# Altium integrated library Altium_WCAP-ATLI_rev19a.IntLib: 162 symbols (part 1 of 2) (continued)
## 860080475018
designator C?, comment 680uF, 25V
WCAP-ATLI THT Aluminum Electrolytic Capacitors, D10mm x L20mm, 680uF, +/-20%, 25VDC; Part Number: 860080475018; Dissipation Factor: 10%; Endurance: 5000h; Leakage Current: 170uA; Ripple Current max.: 1570mA; Technical Reference: ATEF200681M025DSPAAE000; ComponentLink1Description: Manufacturer; ComponentLink1URL: http://www.we-online.de; ComponentLink2Description: Datasheet; ComponentLink2URL: https://katalog.we-online.com/pbs/datasheet/860080475018.pdf; Length: 20mm; Mounting Technology: THT; Operating Temperature: -55 to +105degC; Packaging: Ammo Pack; Published Date: August 2019; Capacitance: 680uF; Diameter: 10mm; Publisher: Wurth Elektronik; Capacitance Tolerance: +/-20%; Rated Voltage: 25VDC
footprint WCAP-ATLI_10x20
pins: 1 N, 2 P

## 860080475019
designator C?, comment 820uF, 25V
WCAP-ATLI THT Aluminum Electrolytic Capacitors, D10mm x L25mm, 820uF, +/-20%, 25VDC; Part Number: 860080475019; Dissipation Factor: 10%; Endurance: 5000h; Leakage Current: 205uA; Ripple Current max.: 1910mA; Technical Reference: ATEF250821M025DSPAAE000; ComponentLink1Description: Manufacturer; ComponentLink1URL: http://www.we-online.de; ComponentLink2Description: Datasheet; ComponentLink2URL: https://katalog.we-online.com/pbs/datasheet/860080475019.pdf; Length: 25mm; Mounting Technology: THT; Operating Temperature: -55 to +105degC; Packaging: Ammo Pack; Published Date: August 2019; Capacitance: 820uF; Diameter: 10mm; Publisher: Wurth Elektronik; Capacitance Tolerance: +/-20%; Rated Voltage: 25VDC
footprint WCAP-ATLI_10x25
pins: 1 N, 2 P

## 860080478020
designator C?, comment 1000uF, 25V
WCAP-ATLI THT Aluminum Electrolytic Capacitors, D13mm x L20mm, 1000uF, +/-20%, 25VDC; Part Number: 860080478020; Dissipation Factor: 10%; Endurance: 5000h; Leakage Current: 250uA; Ripple Current max.: 2340mA; Technical Reference: ATEI200102M025DSPACE000; ComponentLink1Description: Manufacturer; ComponentLink1URL: http://www.we-online.de; ComponentLink2Description: Datasheet; ComponentLink2URL: https://katalog.we-online.com/pbs/datasheet/860080478020.pdf; Length: 20mm; Mounting Technology: THT; Operating Temperature: -55 to +105degC; Packaging: Ammo Pack; Published Date: August 2019; Capacitance: 1000uF; Diameter: 13mm; Publisher: Wurth Elektronik; Capacitance Tolerance: +/-20%; Rated Voltage: 25VDC
footprint WCAP-ATLI_13x20
pins: 1 N, 2 P

## 860080478021
designator C?, comment 1200uF, 25V
WCAP-ATLI THT Aluminum Electrolytic Capacitors, D13mm x L20mm, 1200uF, +/-20%, 25VDC; Part Number: 860080478021; Dissipation Factor: 10%; Endurance: 5000h; Leakage Current: 300uA; Ripple Current max.: 2390mA; Technical Reference: ATEI200122M025DSPACE000; ComponentLink1Description: Manufacturer; ComponentLink1URL: http://www.we-online.de; ComponentLink2Description: Datasheet; ComponentLink2URL: https://katalog.we-online.com/pbs/datasheet/860080478021.pdf; Length: 20mm; Mounting Technology: THT; Operating Temperature: -55 to +105degC; Packaging: Ammo Pack; Published Date: August 2019; Capacitance: 1200uF; Diameter: 13mm; Publisher: Wurth Elektronik; Capacitance Tolerance: +/-20%; Rated Voltage: 25VDC
footprint WCAP-ATLI_13x20
pins: 1 N, 2 P

## 860080478022
designator C?, comment 1500uF, 25V
WCAP-ATLI THT Aluminum Electrolytic Capacitors, D13mm x L25mm, 1500uF, +/-20%, 25VDC; Part Number: 860080478022; Dissipation Factor: 10%; Endurance: 5000h; Leakage Current: 375uA; Ripple Current max.: 2710mA; Technical Reference: ATEI250152M025DSPACE000; ComponentLink1Description: Manufacturer; ComponentLink1URL: http://www.we-online.de; ComponentLink2Description: Datasheet; ComponentLink2URL: https://katalog.we-online.com/pbs/datasheet/860080478022.pdf; Length: 25mm; Mounting Technology: THT; Operating Temperature: -55 to +105degC; Packaging: Ammo Pack; Published Date: August 2019; Capacitance: 1500uF; Diameter: 13mm; Publisher: Wurth Elektronik; Capacitance Tolerance: +/-20%; Rated Voltage: 25VDC
footprint WCAP-ATLI_13x25
pins: 1 N, 2 P

## 860080478023
designator C?, comment 1800uF, 25V
WCAP-ATLI THT Aluminum Electrolytic Capacitors, D13mm x L30mm, 1800uF, +/-20%, 25VDC; Part Number: 860080478023; Dissipation Factor: 10%; Endurance: 5000h; Leakage Current: 450uA; Ripple Current max.: 3150mA; Technical Reference: ATEI300182M025DSPACE000; ComponentLink1Description: Manufacturer; ComponentLink1URL: http://www.we-online.de; ComponentLink2Description: Datasheet; ComponentLink2URL: https://katalog.we-online.com/pbs/datasheet/860080478023.pdf; Length: 30mm; Mounting Technology: THT; Operating Temperature: -55 to +105degC; Packaging: Ammo Pack; Published Date: August 2019; Capacitance: 1800uF; Diameter: 13mm; Publisher: Wurth Elektronik; Capacitance Tolerance: +/-20%; Rated Voltage: 25VDC
footprint WCAP-ATLI_13x30
pins: 1 N, 2 P

## 860080478024
designator C?, comment 2200uF, 25V
WCAP-ATLI THT Aluminum Electrolytic Capacitors, D13mm x L35mm, 2200uF, +/-20%, 25VDC; Part Number: 860080478024; Dissipation Factor: 12%; Endurance: 5000h; Leakage Current: 550uA; Ripple Current max.: 3420mA; Technical Reference: ATEI350222M025DSPABE000; ComponentLink1Description: Manufacturer; ComponentLink1URL: http://www.we-online.de; ComponentLink2Description: Datasheet; ComponentLink2URL: https://katalog.we-online.com/pbs/datasheet/860080478024.pdf; Length: 35mm; Mounting Technology: THT; Operating Temperature: -55 to +105degC; Packaging: Ammo Pack; Published Date: August 2019; Capacitance: 2200uF; Diameter: 13mm; Publisher: Wurth Elektronik; Capacitance Tolerance: +/-20%; Rated Voltage: 25VDC
footprint WCAP-ATLI_13x35
pins: 1 N, 2 P

## 860080480025
designator C?, comment 2700uF, 25V
WCAP-ATLI THT Aluminum Electrolytic Capacitors, D16mm x L31.5mm, 2700uF, +/-20%, 25VDC; Part Number: 860080480025; Dissipation Factor: 12%; Endurance: 5000h; Leakage Current: 675uA; Ripple Current max.: 3480mA; Technical Reference: ATEK315272M025DSPADE000; ComponentLink1Description: Manufacturer; ComponentLink1URL: http://www.we-online.de; ComponentLink2Description: Datasheet; ComponentLink2URL: https://katalog.we-online.com/pbs/datasheet/860080480025.pdf; Length: 31.5mm; Mounting Technology: THT; Operating Temperature: -55 to +105degC; Packaging: Ammo Pack; Published Date: August 2019; Capacitance: 2700uF; Diameter: 16mm; Publisher: Wurth Elektronik; Capacitance Tolerance: +/-20%; Rated Voltage: 25VDC
footprint WCAP-ATLI_16x31.5
pins: 1 N, 2 P

## 860080480026
designator C?, comment 3300uF, 25V
WCAP-ATLI THT Aluminum Electrolytic Capacitors, D16mm x L31.5mm, 3300uF, +/-20%, 25VDC; Part Number: 860080480026; Dissipation Factor: 14%; Endurance: 5000h; Leakage Current: 825uA; Ripple Current max.: 3600mA; Technical Reference: ATEK315332M025DSPADE000; ComponentLink1Description: Manufacturer; ComponentLink1URL: http://www.we-online.de; ComponentLink2Description: Datasheet; ComponentLink2URL: https://katalog.we-online.com/pbs/datasheet/860080480026.pdf; Length: 31.5mm; Mounting Technology: THT; Operating Temperature: -55 to +105degC; Packaging: Ammo Pack; Published Date: August 2019; Capacitance: 3300uF; Diameter: 16mm; Publisher: Wurth Elektronik; Capacitance Tolerance: +/-20%; Rated Voltage: 25VDC
footprint WCAP-ATLI_16x31.5
pins: 1 N, 2 P

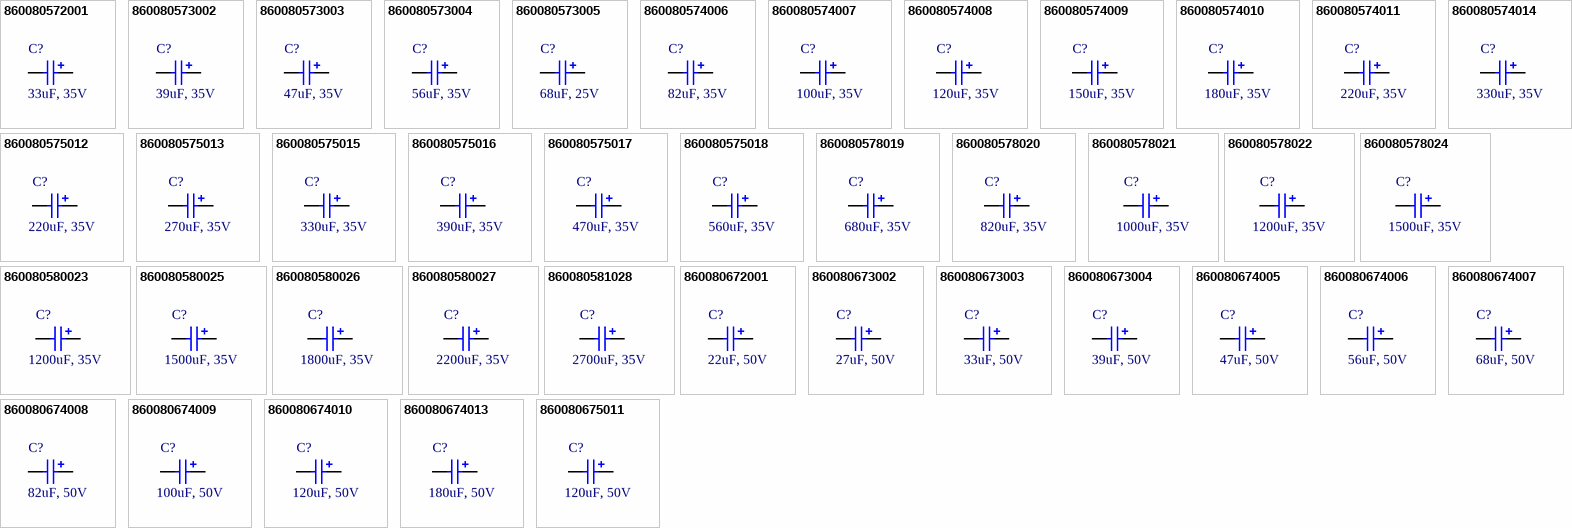
[diagram p2: symbols 860080572001 to 860080675011]

## 860080572001
designator C?, comment 33uF, 35V
WCAP-ATLI THT Aluminum Electrolytic Capacitors, D5mm x L11mm, 33uF, +/-20%, 35VDC; Part Number: 860080572001; Dissipation Factor: 9%; Endurance: 2000h; Leakage Current: 11.55uA; Ripple Current max.: 230mA; Technical Reference: ATEC110330M035DSPA3B000; ComponentLink1Description: Manufacturer; ComponentLink1URL: http://www.we-online.de; ComponentLink2Description: Datasheet; ComponentLink2URL: https://katalog.we-online.com/pbs/datasheet/860080572001.pdf; Length: 11mm; Mounting Technology: THT; Operating Temperature: -55 to +105degC; Packaging: Ammo Pack; Published Date: August 2019; Capacitance: 33uF; Diameter: 5mm; Publisher: Wurth Elektronik; Capacitance Tolerance: +/-20%; Rated Voltage: 35VDC
footprint WCAP-ATLI_5x11
pins: 1 N, 2 P

## 860080573002
designator C?, comment 39uF, 35V
WCAP-ATLI THT Aluminum Electrolytic Capacitors, D6.3mm x L11mm, 39uF, +/-20%, 35VDC; Part Number: 860080573002; Dissipation Factor: 9%; Endurance: 2000h; Leakage Current: 13.65uA; Ripple Current max.: 277mA; Technical Reference: ATED110390M035DSPA4B000; ComponentLink1Description: Manufacturer; ComponentLink1URL: http://www.we-online.de; ComponentLink2Description: Datasheet; ComponentLink2URL: https://katalog.we-online.com/pbs/datasheet/860080573002.pdf; Length: 11mm; Mounting Technology: THT; Operating Temperature: -55 to +105degC; Packaging: Ammo Pack; Published Date: August 2019; Capacitance: 39uF; Diameter: 6.3mm; Publisher: Wurth Elektronik; Capacitance Tolerance: +/-20%; Rated Voltage: 35VDC
footprint WCAP-ATLI_6.3x11
pins: 1 N, 2 P

## 860080573003
designator C?, comment 47uF, 35V
WCAP-ATLI THT Aluminum Electrolytic Capacitors, D6.3mm x L11mm, 47uF, +/-20%, 35VDC; Part Number: 860080573003; Dissipation Factor: 9%; Endurance: 2000h; Leakage Current: 16.45uA; Ripple Current max.: 340mA; Technical Reference: ATED110470M035DSPA4B000; ComponentLink1Description: Manufacturer; ComponentLink1URL: http://www.we-online.de; ComponentLink2Description: Datasheet; ComponentLink2URL: https://katalog.we-online.com/pbs/datasheet/860080573003.pdf; Length: 11mm; Mounting Technology: THT; Operating Temperature: -55 to +105degC; Packaging: Ammo Pack; Published Date: August 2019; Capacitance: 47uF; Diameter: 6.3mm; Publisher: Wurth Elektronik; Capacitance Tolerance: +/-20%; Rated Voltage: 35VDC
footprint WCAP-ATLI_6.3x11
pins: 1 N, 2 P

## 860080573004
designator C?, comment 56uF, 35V
WCAP-ATLI THT Aluminum Electrolytic Capacitors, D6.3mm x L11mm, 56uF, +/-20%, 35VDC; Part Number: 860080573004; Dissipation Factor: 9%; Endurance: 2000h; Leakage Current: 19.6uA; Ripple Current max.: 375mA; Technical Reference: ATED110560M035DSPA4B000; ComponentLink1Description: Manufacturer; ComponentLink1URL: http://www.we-online.de; ComponentLink2Description: Datasheet; ComponentLink2URL: https://katalog.we-online.com/pbs/datasheet/860080573004.pdf; Length: 11mm; Mounting Technology: THT; Operating Temperature: -55 to +105degC; Packaging: Ammo Pack; Published Date: August 2019; Capacitance: 56uF; Diameter: 6.3mm; Publisher: Wurth Elektronik; Capacitance Tolerance: +/-20%; Rated Voltage: 35VDC
footprint WCAP-ATLI_6.3x11
pins: 1 N, 2 P

## 860080573005
designator C?, comment 68uF, 25V
WCAP-ATLI THT Aluminum Electrolytic Capacitors, D6.3mm x L11mm, 68uF, +/-20%, 35VDC; Part Number: 860080473004; Dissipation Factor: 10%; Endurance: 2000h; Leakage Current: 17uA; Ripple Current max.: 300mA; Rated Voltage: 25VDC; Technical Reference: ATED110680M025DSPA4B000; ComponentLink1Description: Manufacturer; ComponentLink1URL: http://www.we-online.de; ComponentLink2Description: Datasheet; ComponentLink2URL: https://katalog.we-online.com/pbs/datasheet/860080473004.pdf; Length: 11mm; Mounting Technology: THT; Operating Temperature: -55 to +105degC; Packaging: Ammo Pack; Published Date: August 2019; Capacitance: 68uF; Diameter: 6.3mm; Publisher: Wurth Elektronik; Capacitance Tolerance: +/-20%
footprint WCAP-ATLI_6.3x11
pins: 1 N, 2 P

## 860080574006
designator C?, comment 82uF, 35V
WCAP-ATLI THT Aluminum Electrolytic Capacitors, D8mm x L11.5mm, 82uF, +/-20%, 35VDC; Part Number: 860080574006; Dissipation Factor: 9%; Endurance: 3000h; Leakage Current: 28.7uA; Ripple Current max.: 480mA; Technical Reference: ATEE115820M035DSPA7C000; ComponentLink1Description: Manufacturer; ComponentLink1URL: http://www.we-online.de; ComponentLink2Description: Datasheet; ComponentLink2URL: https://katalog.we-online.com/pbs/datasheet/860080574006.pdf; Length: 11.5mm; Mounting Technology: THT; Operating Temperature: -55 to +105degC; Packaging: Ammo Pack; Published Date: August 2019; Capacitance: 82uF; Diameter: 8mm; Publisher: Wurth Elektronik; Capacitance Tolerance: +/-20%; Rated Voltage: 35VDC
footprint WCAP-ATLI_8x11.5
pins: 1 N, 2 P

## 860080574007
designator C?, comment 100uF, 35V
WCAP-ATLI THT Aluminum Electrolytic Capacitors, D8mm x L11.5mm, 100uF, +/-20%, 35VDC; Part Number: 860080574007; Dissipation Factor: 9%; Endurance: 3000h; Leakage Current: 35uA; Ripple Current max.: 560mA; Technical Reference: ATEE115101M035DSPA7C000; ComponentLink1Description: Manufacturer; ComponentLink1URL: http://www.we-online.de; ComponentLink2Description: Datasheet; ComponentLink2URL: https://katalog.we-online.com/pbs/datasheet/860080574007.pdf; Length: 11.5mm; Mounting Technology: THT; Operating Temperature: -55 to +105degC; Packaging: Ammo Pack; Published Date: August 2019; Capacitance: 100uF; Diameter: 8mm; Publisher: Wurth Elektronik; Capacitance Tolerance: +/-20%; Rated Voltage: 35VDC
footprint WCAP-ATLI_8x11.5
pins: 1 N, 2 P

## 860080574008
designator C?, comment 120uF, 35V
WCAP-ATLI THT Aluminum Electrolytic Capacitors, D8mm x L11.5mm, 120uF, +/-20%, 35VDC; Part Number: 860080574008; Dissipation Factor: 9%; Endurance: 3000h; Leakage Current: 42uA; Ripple Current max.: 585mA; Technical Reference: ATEE115121M035DSPA7C000; ComponentLink1Description: Manufacturer; ComponentLink1URL: http://www.we-online.de; ComponentLink2Description: Datasheet; ComponentLink2URL: https://katalog.we-online.com/pbs/datasheet/860080574008.pdf; Length: 11.5mm; Mounting Technology: THT; Operating Temperature: -55 to +105degC; Packaging: Ammo Pack; Published Date: August 2019; Capacitance: 120uF; Diameter: 8mm; Publisher: Wurth Elektronik; Capacitance Tolerance: +/-20%; Rated Voltage: 35VDC
footprint WCAP-ATLI_8x11.5
pins: 1 N, 2 P

## 860080574009
designator C?, comment 150uF, 35V
WCAP-ATLI THT Aluminum Electrolytic Capacitors, D8mm x L11.5mm, 150uF, +/-20%, 35VDC; Part Number: 860080574009; Dissipation Factor: 9%; Endurance: 3000h; Leakage Current: 52.5uA; Ripple Current max.: 680mA; Technical Reference: ATEE115151M035DSPA7C000; ComponentLink1Description: Manufacturer; ComponentLink1URL: http://www.we-online.de; ComponentLink2Description: Datasheet; ComponentLink2URL: https://katalog.we-online.com/pbs/datasheet/860080574009.pdf; Length: 11.5mm; Mounting Technology: THT; Operating Temperature: -55 to +105degC; Packaging: Ammo Pack; Published Date: August 2019; Capacitance: 150uF; Diameter: 8mm; Publisher: Wurth Elektronik; Capacitance Tolerance: +/-20%; Rated Voltage: 35VDC
footprint WCAP-ATLI_8x11.5
pins: 1 N, 2 P

## 860080574010
designator C?, comment 180uF, 35V
WCAP-ATLI THT Aluminum Electrolytic Capacitors, D8mm x L16mm, 180uF, +/-20%, 35VDC; Part Number: 860080574010; Dissipation Factor: 9%; Endurance: 3000h; Leakage Current: 63uA; Ripple Current max.: 810mA; Technical Reference: ATEE160181M035DSPA7C000; ComponentLink1Description: Manufacturer; ComponentLink1URL: http://www.we-online.de; ComponentLink2Description: Datasheet; ComponentLink2URL: https://katalog.we-online.com/pbs/datasheet/860080574010.pdf; Length: 16mm; Mounting Technology: THT; Operating Temperature: -55 to +105degC; Packaging: Ammo Pack; Published Date: August 2019; Capacitance: 180uF; Diameter: 8mm; Publisher: Wurth Elektronik; Capacitance Tolerance: +/-20%; Rated Voltage: 35VDC
footprint WCAP-ATLI_8x16
pins: 1 N, 2 P

## 860080574011
designator C?, comment 220uF, 35V
WCAP-ATLI THT Aluminum Electrolytic Capacitors, D8mm x L16mm, 220uF, +/-20%, 35VDC; Part Number: 860080574011; Dissipation Factor: 9%; Endurance: 3000h; Leakage Current: 77uA; Ripple Current max.: 1000mA; Technical Reference: ATEE160221M035DSPA7C000; ComponentLink1Description: Manufacturer; ComponentLink1URL: http://www.we-online.de; ComponentLink2Description: Datasheet; ComponentLink2URL: https://katalog.we-online.com/pbs/datasheet/860080574011.pdf; Length: 16mm; Mounting Technology: THT; Operating Temperature: -55 to +105degC; Packaging: Ammo Pack; Published Date: August 2019; Capacitance: 220uF; Diameter: 8mm; Publisher: Wurth Elektronik; Capacitance Tolerance: +/-20%; Rated Voltage: 35VDC
footprint WCAP-ATLI_8x16
pins: 1 N, 2 P

## 860080574014
designator C?, comment 330uF, 35V
WCAP-ATLI THT Aluminum Electrolytic Capacitors, D8mm x L20mm, 330uF, +/-20%, 35VDC; Part Number: 860080574014; Dissipation Factor: 9%; Endurance: 3000h; Leakage Current: 115.5uA; Ripple Current max.: 1210mA; Technical Reference: ATEE200331M035DSPA7C000; ComponentLink1Description: Manufacturer; ComponentLink1URL: http://www.we-online.de; ComponentLink2Description: Datasheet; ComponentLink2URL: https://katalog.we-online.com/pbs/datasheet/860080574014.pdf; Length: 20mm; Mounting Technology: THT; Operating Temperature: -55 to +105degC; Packaging: Ammo Pack; Published Date: August 2019; Capacitance: 330uF; Diameter: 8mm; Publisher: Wurth Elektronik; Capacitance Tolerance: +/-20%; Rated Voltage: 35VDC
footprint WCAP-ATLI_8x20
pins: 1 N, 2 P

## 860080575012
designator C?, comment 220uF, 35V
WCAP-ATLI THT Aluminum Electrolytic Capacitors, D10mm x L12.5mm, 220uF, +/-20%, 35VDC; Part Number: 860080575012; Dissipation Factor: 9%; Endurance: 5000h; Leakage Current: 77uA; Ripple Current max.: 1060mA; Technical Reference: ATEF125221M035DSPA9E000; ComponentLink1Description: Manufacturer; ComponentLink1URL: http://www.we-online.de; ComponentLink2Description: Datasheet; ComponentLink2URL: https://katalog.we-online.com/pbs/datasheet/860080575012.pdf; Length: 12.5mm; Mounting Technology: THT; Operating Temperature: -55 to +105degC; Packaging: Ammo Pack; Published Date: August 2019; Capacitance: 220uF; Diameter: 10mm; Publisher: Wurth Elektronik; Capacitance Tolerance: +/-20%; Rated Voltage: 35VDC
footprint WCAP-ATLI_10x12.5
pins: 1 N, 2 P

## 860080575013
designator C?, comment 270uF, 35V
WCAP-ATLI THT Aluminum Electrolytic Capacitors, D10mm x L16mm, 270uF, +/-20%, 35VDC; Part Number: 860080575013; Dissipation Factor: 9%; Endurance: 5000h; Leakage Current: 94.5uA; Ripple Current max.: 1190mA; Technical Reference: ATEF160271M035DSPAAE000; ComponentLink1Description: Manufacturer; ComponentLink1URL: http://www.we-online.de; ComponentLink2Description: Datasheet; ComponentLink2URL: https://katalog.we-online.com/pbs/datasheet/860080575013.pdf; Length: 16mm; Mounting Technology: THT; Operating Temperature: -55 to +105degC; Packaging: Ammo Pack; Published Date: August 2019; Capacitance: 270uF; Diameter: 10mm; Publisher: Wurth Elektronik; Capacitance Tolerance: +/-20%; Rated Voltage: 35VDC
footprint WCAP-ATLI_10x16
pins: 1 N, 2 P

## 860080575015
designator C?, comment 330uF, 35V
WCAP-ATLI THT Aluminum Electrolytic Capacitors, D10mm x L16mm, 330uF, +/-20%, 35VDC; Part Number: 860080575015; Dissipation Factor: 9%; Endurance: 5000h; Leakage Current: 115.5uA; Ripple Current max.: 1400mA; Technical Reference: ATEF160331M035DSPAAE000; ComponentLink1Description: Manufacturer; ComponentLink1URL: http://www.we-online.de; ComponentLink2Description: Datasheet; ComponentLink2URL: https://katalog.we-online.com/pbs/datasheet/860080575015.pdf; Length: 16mm; Mounting Technology: THT; Operating Temperature: -55 to +105degC; Packaging: Ammo Pack; Published Date: August 2019; Capacitance: 330uF; Diameter: 10mm; Publisher: Wurth Elektronik; Capacitance Tolerance: +/-20%; Rated Voltage: 35VDC
footprint WCAP-ATLI_10x16
pins: 1 N, 2 P

## 860080575016
designator C?, comment 390uF, 35V
WCAP-ATLI THT Aluminum Electrolytic Capacitors, D10mm x L20mm, 390uF, +/-20%, 35VDC; Part Number: 860080575016; Dissipation Factor: 9%; Endurance: 5000h; Leakage Current: 136.5uA; Ripple Current max.: 1550mA; Technical Reference: ATEF200391M035DSPAAE000; ComponentLink1Description: Manufacturer; ComponentLink1URL: http://www.we-online.de; ComponentLink2Description: Datasheet; ComponentLink2URL: https://katalog.we-online.com/pbs/datasheet/860080575016.pdf; Length: 20mm; Mounting Technology: THT; Operating Temperature: -55 to +105degC; Packaging: Ammo Pack; Published Date: August 2019; Capacitance: 390uF; Diameter: 10mm; Publisher: Wurth Elektronik; Capacitance Tolerance: +/-20%; Rated Voltage: 35VDC
footprint WCAP-ATLI_10x20
pins: 1 N, 2 P

## 860080575017
designator C?, comment 470uF, 35V
WCAP-ATLI THT Aluminum Electrolytic Capacitors, D10mm x L20mm, 470uF, +/-20%, 35VDC; Part Number: 860080575017; Dissipation Factor: 9%; Endurance: 5000h; Leakage Current: 164.5uA; Ripple Current max.: 1850mA; Technical Reference: ATEF200471M035DSPAAE000; ComponentLink1Description: Manufacturer; ComponentLink1URL: http://www.we-online.de; ComponentLink2Description: Datasheet; ComponentLink2URL: https://katalog.we-online.com/pbs/datasheet/860080575017.pdf; Length: 20mm; Mounting Technology: THT; Operating Temperature: -55 to +105degC; Packaging: Ammo Pack; Published Date: August 2019; Capacitance: 470uF; Diameter: 10mm; Publisher: Wurth Elektronik; Capacitance Tolerance: +/-20%; Rated Voltage: 35VDC
footprint WCAP-ATLI_10x20
pins: 1 N, 2 P

## 860080575018
designator C?, comment 560uF, 35V
WCAP-ATLI THT Aluminum Electrolytic Capacitors, D10mm x L25mm, 560uF, +/-20%, 35VDC; Part Number: 860080575018; Dissipation Factor: 9%; Endurance: 5000h; Leakage Current: 196uA; Ripple Current max.: 2040mA; Technical Reference: ATEF250561M035DSPAAE000; ComponentLink1Description: Manufacturer; ComponentLink1URL: http://www.we-online.de; ComponentLink2Description: Datasheet; ComponentLink2URL: https://katalog.we-online.com/pbs/datasheet/860080575018.pdf; Length: 25mm; Mounting Technology: THT; Operating Temperature: -55 to +105degC; Packaging: Ammo Pack; Published Date: August 2019; Capacitance: 560uF; Diameter: 10mm; Publisher: Wurth Elektronik; Capacitance Tolerance: +/-20%; Rated Voltage: 35VDC
footprint WCAP-ATLI_10x25
pins: 1 N, 2 P

## 860080578019
designator C?, comment 680uF, 35V
WCAP-ATLI THT Aluminum Electrolytic Capacitors, D13mm x L20mm, 680uF, +/-20%, 35VDC; Part Number: 860080578019; Dissipation Factor: 9%; Endurance: 5000h; Leakage Current: 238uA; Ripple Current max.: 2260mA; Technical Reference: ATEI200681M035DSPACE000; ComponentLink1Description: Manufacturer; ComponentLink1URL: http://www.we-online.de; ComponentLink2Description: Datasheet; ComponentLink2URL: https://katalog.we-online.com/pbs/datasheet/860080578019.pdf; Length: 20mm; Mounting Technology: THT; Operating Temperature: -55 to +105degC; Packaging: Ammo Pack; Published Date: August 2019; Capacitance: 680uF; Diameter: 13mm; Publisher: Wurth Elektronik; Capacitance Tolerance: +/-20%; Rated Voltage: 35VDC
footprint WCAP-ATLI_13x20
pins: 1 N, 2 P

## 860080578020
designator C?, comment 820uF, 35V
WCAP-ATLI THT Aluminum Electrolytic Capacitors, D13mm x L25mm, 820uF, +/-20%, 35VDC; Part Number: 860080578020; Dissipation Factor: 9%; Endurance: 5000h; Leakage Current: 287uA; Ripple Current max.: 2630mA; Technical Reference: ATEI250821M035DSPACE000; ComponentLink1Description: Manufacturer; ComponentLink1URL: http://www.we-online.de; ComponentLink2Description: Datasheet; ComponentLink2URL: https://katalog.we-online.com/pbs/datasheet/860080578020.pdf; Length: 25mm; Mounting Technology: THT; Operating Temperature: -55 to +105degC; Packaging: Ammo Pack; Published Date: August 2019; Capacitance: 820uF; Diameter: 13mm; Publisher: Wurth Elektronik; Capacitance Tolerance: +/-20%; Rated Voltage: 35VDC
footprint WCAP-ATLI_13x25
pins: 1 N, 2 P

## 860080578021
designator C?, comment 1000uF, 35V
WCAP-ATLI THT Aluminum Electrolytic Capacitors, D13mm x L25mm, 1000uF, +/-20%, 35VDC; Part Number: 860080578021; Dissipation Factor: 9%; Endurance: 5000h; Leakage Current: 350uA; Ripple Current max.: 2780mA; Technical Reference: ATEI250102M035DSPACE000; ComponentLink1Description: Manufacturer; ComponentLink1URL: http://www.we-online.de; ComponentLink2Description: Datasheet; ComponentLink2URL: https://katalog.we-online.com/pbs/datasheet/860080578021.pdf; Length: 25mm; Mounting Technology: THT; Operating Temperature: -55 to +105degC; Packaging: Ammo Pack; Published Date: August 2019; Capacitance: 1000uF; Diameter: 13mm; Publisher: Wurth Elektronik; Capacitance Tolerance: +/-20%; Rated Voltage: 35VDC
footprint WCAP-ATLI_13x25
pins: 1 N, 2 P

## 860080578022
designator C?, comment 1200uF, 35V
WCAP-ATLI THT Aluminum Electrolytic Capacitors, D13mm x L30mm, 1200uF, +/-20%, 35VDC; Part Number: 860080578022; Dissipation Factor: 9%; Endurance: 5000h; Leakage Current: 420uA; Ripple Current max.: 2950mA; Technical Reference: ATEI300122M035DSPACE000; ComponentLink1Description: Manufacturer; ComponentLink1URL: http://www.we-online.de; ComponentLink2Description: Datasheet; ComponentLink2URL: https://katalog.we-online.com/pbs/datasheet/860080578022.pdf; Length: 30mm; Mounting Technology: THT; Operating Temperature: -55 to +105degC; Packaging: Ammo Pack; Published Date: August 2019; Capacitance: 1200uF; Diameter: 13mm; Publisher: Wurth Elektronik; Capacitance Tolerance: +/-20%; Rated Voltage: 35VDC
footprint WCAP-ATLI_13x30
pins: 1 N, 2 P

## 860080578024
designator C?, comment 1500uF, 35V
WCAP-ATLI THT Aluminum Electrolytic Capacitors, D13mm x L35mm, 1500uF, +/-20%, 35VDC; Part Number: 860080578024; Dissipation Factor: 9%; Endurance: 5000h; Leakage Current: 525uA; Ripple Current max.: 3350mA; Technical Reference: ATEI350152M035DSPABE000; ComponentLink1Description: Manufacturer; ComponentLink1URL: http://www.we-online.de; ComponentLink2Description: Datasheet; ComponentLink2URL: https://katalog.we-online.com/pbs/datasheet/860080578024.pdf; Length: 35mm; Mounting Technology: THT; Operating Temperature: -55 to +105degC; Packaging: Ammo Pack; Published Date: August 2019; Capacitance: 1500uF; Diameter: 13mm; Publisher: Wurth Elektronik; Capacitance Tolerance: +/-20%; Rated Voltage: 35VDC
footprint WCAP-ATLI_13x35
pins: 1 N, 2 P

## 860080580023
designator C?, comment 1200uF, 35V
WCAP-ATLI THT Aluminum Electrolytic Capacitors, D16mm x L25mm, 1200uF, +/-20%, 35VDC; Part Number: 860080580023; Dissipation Factor: 9%; Endurance: 5000h; Leakage Current: 420uA; Ripple Current max.: 3150mA; Technical Reference: ATEK250122M035DSPAEE000; ComponentLink1Description: Manufacturer; ComponentLink1URL: http://www.we-online.de; ComponentLink2Description: Datasheet; ComponentLink2URL: https://katalog.we-online.com/pbs/datasheet/860080580023.pdf; Length: 25mm; Mounting Technology: THT; Operating Temperature: -55 to +105degC; Packaging: Ammo Pack; Published Date: August 2019; Capacitance: 1200uF; Diameter: 16mm; Publisher: Wurth Elektronik; Capacitance Tolerance: +/-20%; Rated Voltage: 35VDC
footprint WCAP-ATLI_16x25
pins: 1 N, 2 P

## 860080580025
designator C?, comment 1500uF, 35V
WCAP-ATLI THT Aluminum Electrolytic Capacitors, D16mm x L31.5mm, 1500uF, +/-20%, 35VDC; Part Number: 860080580025; Dissipation Factor: 9%; Endurance: 5000h; Leakage Current: 525uA; Ripple Current max.: 3600mA; Technical Reference: ATEK315152M035DSPADE000; ComponentLink1Description: Manufacturer; ComponentLink1URL: http://www.we-online.de; ComponentLink2Description: Datasheet; ComponentLink2URL: https://katalog.we-online.com/pbs/datasheet/860080580025.pdf; Length: 31.5mm; Mounting Technology: THT; Operating Temperature: -55 to +105degC; Packaging: Ammo Pack; Published Date: August 2019; Capacitance: 1500uF; Diameter: 16mm; Publisher: Wurth Elektronik; Capacitance Tolerance: +/-20%; Rated Voltage: 35VDC
footprint WCAP-ATLI_16x31.5
pins: 1 N, 2 P

## 860080580026
designator C?, comment 1800uF, 35V
WCAP-ATLI THT Aluminum Electrolytic Capacitors, D16mm x L31.5mm, 1800uF, +/-20%, 35VDC; Part Number: 860080580026; Dissipation Factor: 9%; Endurance: 5000h; Leakage Current: 630uA; Ripple Current max.: 3670mA; Technical Reference: ATEK315182M035DSPADE000; ComponentLink1Description: Manufacturer; ComponentLink1URL: http://www.we-online.de; ComponentLink2Description: Datasheet; ComponentLink2URL: https://katalog.we-online.com/pbs/datasheet/860080580026.pdf; Length: 31.5mm; Mounting Technology: THT; Operating Temperature: -55 to +105degC; Packaging: Ammo Pack; Published Date: August 2019; Capacitance: 1800uF; Diameter: 16mm; Publisher: Wurth Elektronik; Capacitance Tolerance: +/-20%; Rated Voltage: 35VDC
footprint WCAP-ATLI_16x31.5
pins: 1 N, 2 P
